# Altium footprint library SG_PCB_Fomin.PcbLib: 74 footprints (part 3 of 5)
Each footprint in its own frame and in the unit in brackets; x right, y up, seen from the top. Pads: shape width x height; smd on the part's side, far side on the other; paste and mask are expansions set on the pad; w line width, h text height; cw(c..) or ccw(c..) is an arc to the next point about the centre after c.
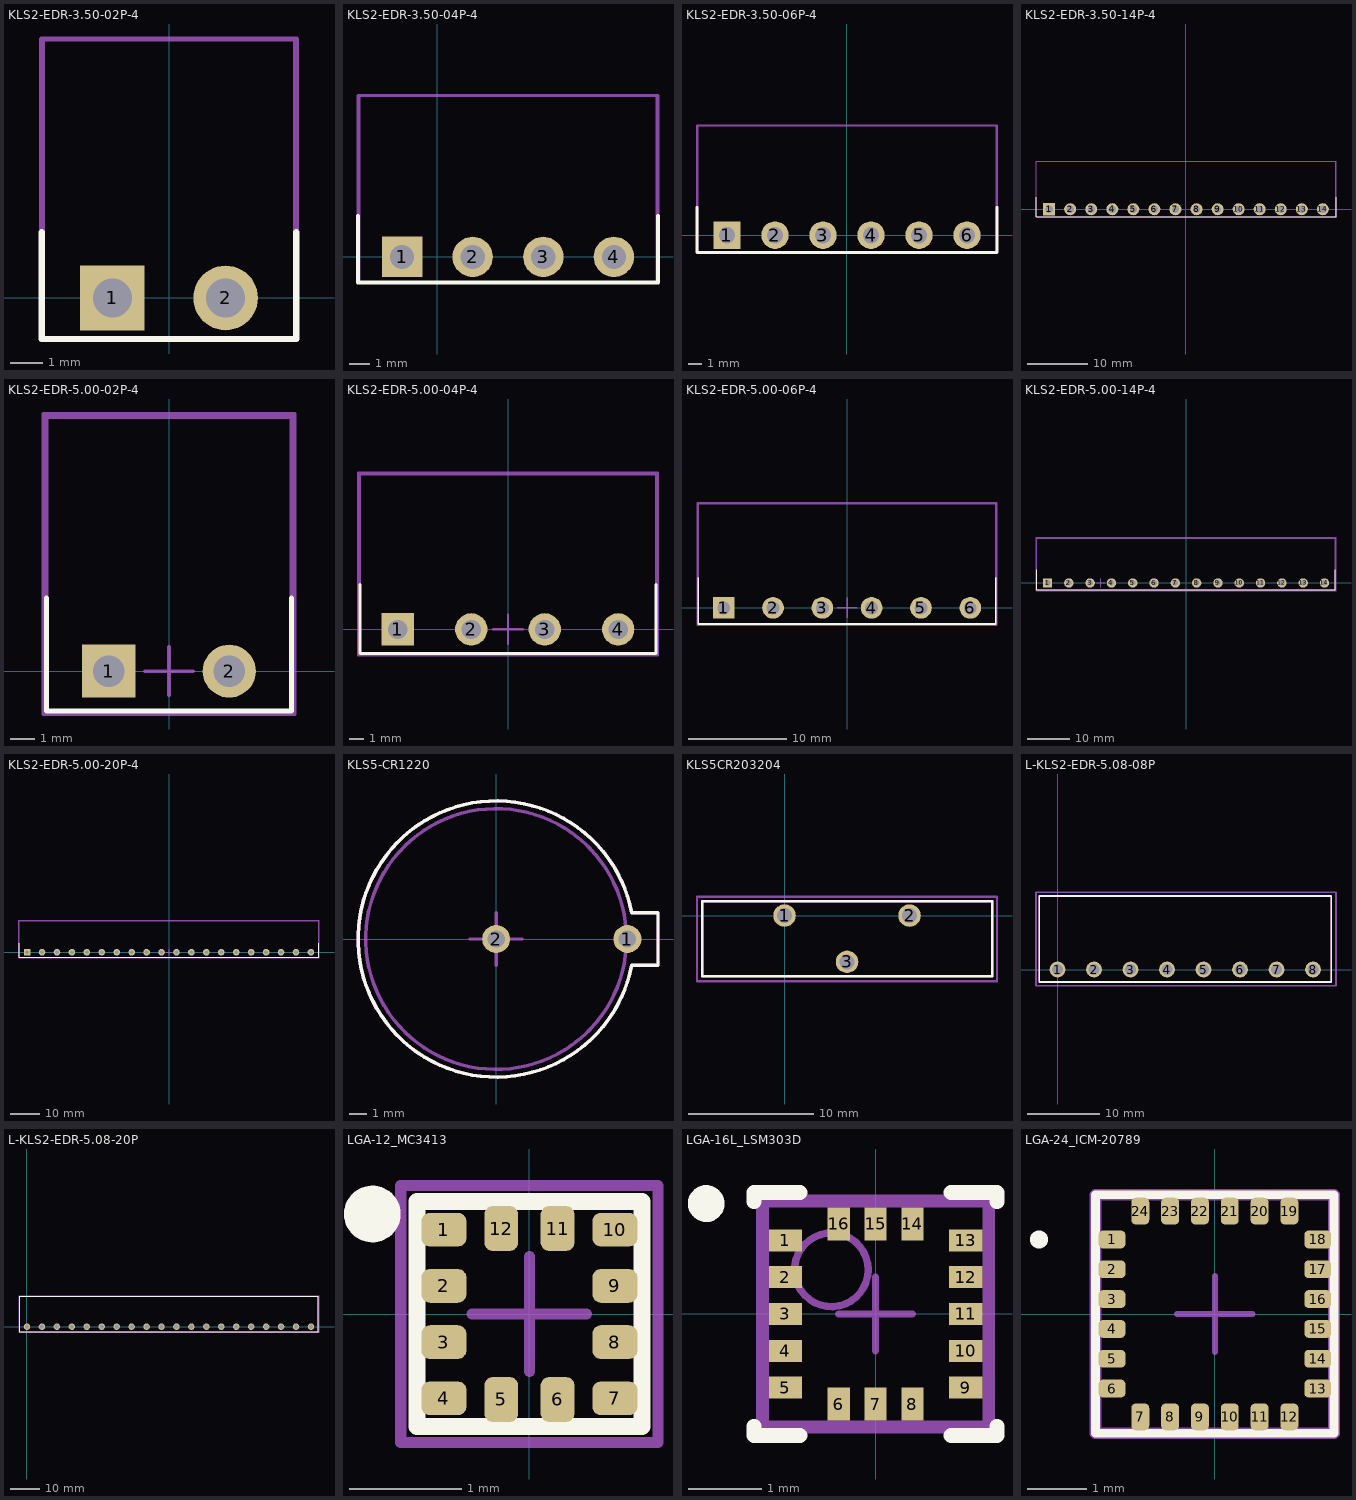
[diagram p2: the footprints below, top view; thin cyan lines are the x and y axes]

## KLS2-EDR-3.50-02P-4 [mm]
pads (2):
  rect 2x2 hole 1.2: 1(-1.75,0)
  round 2 hole 1.2: 2(1.75,0)
Top Overlay:
  lines w0.2: -3.937,2.032 -3.937,-1.27 3.937,-1.27 3.937,2.032
Top Assembly:
  lines w0.15: -3.937,-1.27 -3.937,8.001 3.937,8.001 3.937,-1.27 -3.937,-1.27
Top Courtyard:
  lines w0.15: -3.9,-1.27 3.9,-1.27 3.9,8 -3.9,8 -3.9,-1.27
3D body "User Library-15EDGRC-3_5-2.step": height 7.2, standoff -3.4, extent -3.9,-1.2 3.9,8

## KLS2-EDR-3.50-04P-4 [mm]
pads (4):
  rect 2x2 hole 1.2: 1(-1.75,0)
  round 2 hole 1.2: 2(1.75,0) 3(5.25,0) 4(8.75,0)
Top Overlay:
  lines w0.2: -3.937,2.032 -3.937,-1.27 3.937,-1.27 ; 3.063,-1.27 10.937,-1.27 10.937,2.032
Top Assembly:
  lines w0.15: 3.063,-1.27 10.937,-1.27 10.937,8.001 3.063,8.001 ; 3.937,-1.27 -3.937,-1.27 -3.937,8.001 3.937,8.001
Top Courtyard:
  lines w0.15: 3.1,-1.27 10.9,-1.27 10.9,8 3.1,8 ; 3.9,-1.27 -3.9,-1.27 -3.9,8 3.9,8
3D body "User Library-15EDGRC-3_5-04P.step": height 7.2, standoff -3.4, extent -3.9,-1.175 10.9,8.025

## KLS2-EDR-3.50-06P-4 [mm]
pads (6):
  rect 2x2 hole 1.2: 1(-8.75,0)
  round 2 hole 1.2: 2(-5.25,0) 3(-1.75,0) 4(1.75,0) 5(5.25,0) 6(8.75,0)
Top Overlay:
  lines w0.2: -10.937,2.032 -10.937,-1.27 -3.063,-1.27 ; -3.937,-1.27 3.937,-1.27 ; 3.063,-1.27 10.937,-1.27 10.937,2.032
Top Assembly:
  lines w0.15: -3.937,-1.27 3.937,-1.27 ; -3.937,8.001 3.937,8.001 ; -3.063,-1.27 -10.937,-1.27 -10.937,8.001 -3.063,8.001 ; 3.063,-1.27 10.937,-1.27 10.937,8.001 3.063,8.001
Top Courtyard:
  lines w0.15: -3.9,-1.27 3.9,-1.27 ; -3.9,8 3.9,8 ; -3.1,-1.27 -10.9,-1.27 -10.9,8 -3.1,8 ; 3.1,-1.27 10.9,-1.27 10.9,8 3.1,8
3D body "User Library-15EDGRC-3_5-2.step": height 7.2, standoff -3.4, extent 3.1,-1.2 10.9,8
3D body "User Library-15EDGRC-3_5-2.step": height 7.2, standoff -3.4, extent -3.9,-1.2 3.9,8
3D body "User Library-15EDGRC-3_5-2.step": height 7.2, standoff -3.4, extent -10.9,-1.2 -3.1,8

## KLS2-EDR-3.50-14P-4 [mm]
pads (14):
  rect 2x2 hole 1.2: 1(-22.75,0)
  round 2 hole 1.2: 2(-19.25,0) 3(-15.75,0) 4(-12.25,0) 5(-8.75,0) 6(-5.25,0) 7(-1.75,0) 8(1.75,0) 9(5.25,0) 10(8.75,0) 11(12.25,0) 12(15.75,0) 13(19.25,0) 14(22.75,0)
Top Overlay:
  lines w0.2: -24.937,2.032 -24.937,-1.27 -17.063,-1.27 ; -17.937,-1.27 -10.063,-1.27 ; -10.937,-1.27 -3.063,-1.27 ; -3.937,-1.27 3.937,-1.27 ; 3.063,-1.27 10.937,-1.27 ; 10.063,-1.27 17.937,-1.27 ; 17.063,-1.27 24.937,-1.27 24.937,2.032
Top Assembly:
  lines w0.15: -17.937,-1.27 -10.063,-1.27 ; -17.937,8.001 -10.063,8.001 ; -17.063,-1.27 -24.937,-1.27 -24.937,8.001 -17.063,8.001 ; -10.937,-1.27 -3.063,-1.27 ; -10.937,8.001 -3.063,8.001 ; -3.937,-1.27 3.937,-1.27 ; -3.937,8.001 3.937,8.001 ; 3.063,-1.27 10.937,-1.27 ; 3.063,8.001 10.937,8.001 ; 10.063,-1.27 17.937,-1.27 ; 10.063,8.001 17.937,8.001 ; 17.063,-1.27 24.937,-1.27 24.937,8.001 17.063,8.001
Top Courtyard:
  lines w0.15: -17.9,-1.27 -10.1,-1.27 ; -17.9,8 -10.1,8 ; -17.1,-1.27 -24.9,-1.27 -24.9,8 -17.1,8 ; -10.9,-1.27 -3.1,-1.27 ; -10.9,8 -3.1,8 ; -3.9,-1.27 3.9,-1.27 ; -3.9,8 3.9,8 ; 3.1,-1.27 10.9,-1.27 ; 3.1,8 10.9,8 ; 10.1,-1.27 17.9,-1.27 ; 10.1,8 17.9,8 ; 17.1,-1.27 24.9,-1.27 24.9,8 17.1,8
3D body "User Library-15EDGRC-3_5-2.step": height 7.2, standoff -3.4, extent 17.1,-1.2 24.9,8
3D body "User Library-15EDGRC-3_5-2.step": height 7.2, standoff -3.4, extent 10.1,-1.2 17.9,8
3D body "User Library-15EDGRC-3_5-2.step": height 7.2, standoff -3.4, extent 3.1,-1.2 10.9,8
3D body "User Library-15EDGRC-3_5-2.step": height 7.2, standoff -3.4, extent -3.9,-1.2 3.9,8
3D body "User Library-15EDGRC-3_5-2.step": height 7.2, standoff -3.4, extent -10.9,-1.2 -3.1,8
3D body "User Library-15EDGRC-3_5-2.step": height 7.2, standoff -3.4, extent -17.9,-1.2 -10.1,8
3D body "User Library-15EDGRC-3_5-2.step": height 7.2, standoff -3.4, extent -24.9,-1.2 -17.1,8

## KLS2-EDR-5.00-02P-4 [mm]
pads (2):
  rect 2.2x2.2 hole 1.3: 1(-2.5,0)
  round 2.2 hole 1.3: 2(2.5,0)
Top Overlay:
  lines w0.2: -5.08,3.048 -5.08,-1.651 5.08,-1.651 5.08,3.048
Top Assembly:
  lines w0.15: -5.08,-1.651 5.08,-1.651 5.08,10.541 -5.08,10.541 -5.08,-1.651
Top Courtyard:
  lines w0.15: -1,0 1,0 ; 0,-1 0,1 ; -5.207,-1.778 5.207,-1.778 5.207,10.668 -5.207,10.668 -5.207,-1.778
Top Designator:
  text ".Designator" at -6.858,3.81 h1.52
3D body "KLS2-EDR-5.00-2P.STEP": height 8.2, standoff -4, extent -5.04,-1.6 5.04,10.5

## KLS2-EDR-5.00-04P-4 [mm]
pads (4):
  rect 2.2x2.2 hole 1.3: 1(-7.5,0)
  round 2.2 hole 1.3: 2(-2.5,0) 3(2.5,0) 4(7.5,0)
Top Overlay:
  lines w0.2: -10.08,3.048 -10.08,-1.651 0.08,-1.651 ; -0.08,-1.651 10.08,-1.651 10.08,3.048
Top Assembly:
  lines w0.15: -0.08,-1.651 10.08,-1.651 10.08,10.541 -0.08,10.541 ; 0.08,-1.651 -10.08,-1.651 -10.08,10.541 0.08,10.541
Top Courtyard:
  lines w0.15: -1,0 1,0 ; -0.207,-1.778 10.207,-1.778 10.207,10.668 -0.207,10.668 ; 0,-1 0,1 ; 0.207,-1.778 -10.207,-1.778 -10.207,10.668 0.207,10.668
Top Designator:
  text ".Designator" at -6.837,4.24 h1.52
3D body "KLS2-EDR-5.00-2P.STEP": height 8.2, standoff -4, extent -10.04,-1.6 0.04,10.5
3D body "KLS2-EDR-5.00-2P.STEP": height 8.2, standoff -4, extent -0.04,-1.6 10.04,10.5

## KLS2-EDR-5.00-06P-4 [mm]
pads (6):
  rect 2.2x2.2 hole 1.3: 1(-12.5,0)
  round 2.2 hole 1.3: 2(-7.5,0) 3(-2.5,0) 4(2.5,0) 5(7.5,0) 6(12.5,0)
Top Overlay:
  lines w0.2: -15.08,3.048 -15.08,-1.651 -4.92,-1.651 4.92,-1.651 15.08,-1.651 15.08,3.048
Top Assembly:
  lines w0.15: -5.08,-1.651 5.08,-1.651 ; -5.08,10.541 5.08,10.541 ; -4.92,-1.651 -15.08,-1.651 -15.08,10.541 -4.92,10.541 ; 4.92,-1.651 15.08,-1.651 15.08,10.541 4.92,10.541
Top Courtyard:
  lines w0.15: -5.207,-1.778 5.207,-1.778 ; -5.207,10.668 5.207,10.668 ; -4.793,-1.778 -15.207,-1.778 -15.207,10.668 -4.793,10.668 ; -1,0 1,0 ; 0,-1 0,1 ; 4.793,-1.778 15.207,-1.778 15.207,10.668 4.793,10.668
Top Designator:
  text ".Designator" at -7.246,3.262 h1.52
3D body "KLS2-EDR-5.00-2P.STEP": height 8.2, standoff -4, extent 4.96,-1.6 15.04,10.5
3D body "KLS2-EDR-5.00-2P.STEP": height 8.2, standoff -4, extent -5.04,-1.6 5.04,10.5
3D body "KLS2-EDR-5.00-2P.STEP": height 8.2, standoff -4, extent -15.04,-1.6 -4.96,10.5

## KLS2-EDR-5.00-14P-4 [mm]
pads (14):
  rect 2.2x2.2 hole 1.3: 1(-32.5,0)
  round 2.2 hole 1.3: 2(-27.5,0) 3(-22.5,0) 4(-17.5,0) 5(-12.5,0) 6(-7.5,0) 7(-2.5,0) 8(2.5,0) 9(7.5,0) 10(12.5,0) 11(17.5,0) 12(22.5,0) 13(27.5,0) 14(32.5,0)
Top Overlay:
  lines w0.2: -35.08,3.048 -35.08,-1.651 -24.92,-1.651 -15.08,-1.651 -4.92,-1.651 ; -5.08,-1.651 5.08,-1.651 14.92,-1.651 25.08,-1.651 ; 24.92,-1.651 35.08,-1.651 35.08,3.048
Top Assembly:
  lines w0.15: -25.08,-1.651 -14.92,-1.651 ; -25.08,10.541 -14.92,10.541 ; -24.92,-1.651 -35.08,-1.651 -35.08,10.541 -24.92,10.541 ; -15.08,-1.651 -4.92,-1.651 ; -15.08,10.541 -4.92,10.541 ; -5.08,-1.651 5.08,-1.651 ; -5.08,10.541 5.08,10.541 ; 4.92,-1.651 15.08,-1.651 ; 4.92,10.541 15.08,10.541 ; 14.92,-1.651 25.08,-1.651 ; 14.92,10.541 25.08,10.541 ; 24.92,-1.651 35.08,-1.651 35.08,10.541 24.92,10.541
Top Courtyard:
  lines w0.15: -25.207,-1.778 -14.793,-1.778 ; -25.207,10.668 -14.793,10.668 ; -24.793,-1.778 -35.207,-1.778 -35.207,10.668 -24.793,10.668 ; -21,0 -19,0 ; -20,-1 -20,1 ; -15.207,-1.778 -4.793,-1.778 ; -15.207,10.668 -4.793,10.668 ; -5.207,-1.778 5.207,-1.778 ; -5.207,10.668 5.207,10.668 ; 4.793,-1.778 15.207,-1.778 ; 4.793,10.668 15.207,10.668 ; 14.793,-1.778 25.207,-1.778 ; 14.793,10.668 25.207,10.668 ; 24.793,-1.778 35.207,-1.778 35.207,10.668 24.793,10.668
Top Designator:
  text ".Designator" at -6.624,3.281 h1.52
3D body "KLS2-EDR-5.00-2P.STEP": height 8.2, standoff -4, extent 24.96,-1.6 35.04,10.5
3D body "KLS2-EDR-5.00-2P.STEP": height 8.2, standoff -4, extent -5.04,-1.6 5.04,10.5
3D body "KLS2-EDR-5.00-2P.STEP": height 8.2, standoff -4, extent 4.96,-1.6 15.04,10.5
3D body "KLS2-EDR-5.00-2P.STEP": height 8.2, standoff -4, extent 14.96,-1.6 25.04,10.5
3D body "KLS2-EDR-5.00-2P.STEP": height 8.2, standoff -4, extent -35.04,-1.6 -24.96,10.5
3D body "KLS2-EDR-5.00-2P.STEP": height 8.2, standoff -4, extent -25.04,-1.6 -14.96,10.5
3D body "KLS2-EDR-5.00-2P.STEP": height 8.2, standoff -4, extent -15.04,-1.6 -4.96,10.5

## KLS2-EDR-5.00-20P-4 [mm]
pads (20):
  rect 2.2x2.2 hole 1.3: 1(-47.5,0)
  round 2.2 hole 1.3: 2(-42.5,0) 3(-37.5,0) 4(-32.5,0) 5(-27.5,0) 6(-22.5,0) 7(-17.5,0) 8(-12.5,0) 9(-7.5,0) 10(-2.5,0) 11(2.5,0) 12(7.5,0) 13(12.5,0) 14(17.5,0) 15(22.5,0) 16(27.5,0) 17(32.5,0) 18(37.5,0) 19(42.5,0) 20(47.5,0)
Top Overlay:
  lines w0.2: -50.08,3.048 -50.08,-1.651 -39.92,-1.651 -30.08,-1.651 -19.92,-1.651 -10.08,-1.651 0.08,-1.651 9.92,-1.651 20.08,-1.651 29.92,-1.651 40.08,-1.651 ; 39.92,-1.651 50.08,-1.651 50.08,3.048
Top Assembly:
  lines w0.15: -40.08,-1.651 -29.92,-1.651 ; -40.08,10.541 -29.92,10.541 ; -39.92,-1.651 -50.08,-1.651 -50.08,10.541 -39.92,10.541 ; -30.08,-1.651 -19.92,-1.651 ; -30.08,10.541 -19.92,10.541 ; -20.08,-1.651 -9.92,-1.651 ; -20.08,10.541 -9.92,10.541 ; -10.08,-1.651 0.08,-1.651 ; -10.08,10.541 0.08,10.541 ; -0.08,-1.651 10.08,-1.651 ; -0.08,10.541 10.08,10.541 ; 9.92,-1.651 20.08,-1.651 ; 9.92,10.541 20.08,10.541 ; 19.92,-1.651 30.08,-1.651 ; 19.92,10.541 30.08,10.541 ; 29.92,-1.651 40.08,-1.651 ; 29.92,10.541 40.08,10.541 ; 39.92,-1.651 50.08,-1.651 50.08,10.541 39.92,10.541
Top Courtyard:
  lines w0.15: -40.207,-1.778 -29.793,-1.778 ; -40.207,10.668 -29.793,10.668 ; -39.793,-1.778 -50.207,-1.778 -50.207,10.668 -39.793,10.668 ; -30.207,-1.778 -19.793,-1.778 ; -30.207,10.668 -19.793,10.668 ; -20.207,-1.778 -9.793,-1.778 ; -20.207,10.668 -9.793,10.668 ; -10.207,-1.778 0.207,-1.778 ; -10.207,10.668 0.207,10.668 ; -1,0 1,0 ; -0.207,-1.778 10.207,-1.778 ; -0.207,10.668 10.207,10.668 ; 0,-1 0,1 ; 9.793,-1.778 20.207,-1.778 ; 9.793,10.668 20.207,10.668 ; 19.793,-1.778 30.207,-1.778 ; 19.793,10.668 30.207,10.668 ; 29.793,-1.778 40.207,-1.778 ; 29.793,10.668 40.207,10.668 ; 39.793,-1.778 50.207,-1.778 50.207,10.668 39.793,10.668
Top Designator:
  text ".Designator" at -7.246,3.262 h1.52
3D body "KLS2-EDR-5.00-2P.STEP": height 8.2, standoff -4, extent -50.04,-1.6 -39.96,10.5
3D body "KLS2-EDR-5.00-2P.STEP": height 8.2, standoff -4, extent -40.04,-1.6 -29.96,10.5
3D body "KLS2-EDR-5.00-2P.STEP": height 8.2, standoff -4, extent -30.04,-1.6 -19.96,10.5
3D body "KLS2-EDR-5.00-2P.STEP": height 8.2, standoff -4, extent -20.04,-1.6 -9.96,10.5
3D body "KLS2-EDR-5.00-2P.STEP": height 8.2, standoff -4, extent -10.04,-1.6 0.04,10.5
3D body "KLS2-EDR-5.00-2P.STEP": height 8.2, standoff -4, extent -0.04,-1.6 10.04,10.5
3D body "KLS2-EDR-5.00-2P.STEP": height 8.2, standoff -4, extent 9.96,-1.6 20.04,10.5
3D body "KLS2-EDR-5.00-2P.STEP": height 8.2, standoff -4, extent 19.96,-1.6 30.04,10.5
3D body "KLS2-EDR-5.00-2P.STEP": height 8.2, standoff -4, extent 29.96,-1.6 40.04,10.5
3D body "KLS2-EDR-5.00-2P.STEP": height 8.2, standoff -4, extent 39.96,-1.6 50.04,10.5

## KLS5-CR1220 [mm] "Battery slot 1220"
pads (2):
  round 1.6 hole 1: 1(7.5,0) 2(0,0)
Top Overlay:
  lines w0.2: 7.75,-1.5 cw(c0,0) 7.75,1.5 9.25,1.5 9.25,-1.5 7.75,-1.5
Top Assembly:
  circle w0.2: c0,0 r7.45
Top Courtyard:
  lines w0.2: -1.5,0 1.5,0 ; 0,-1.5 0,1.5 ; 7.75,-1.5 cw(c0,0) 7.75,1.5 9.25,1.5 9.25,-1.5 7.75,-1.5

## KLS5CR203204 [mm]
pads (3):
  round 1.8 hole 1.2: 1(0,0) 2(10,0) 3(5,-3.7)
Top Overlay:
  lines w0.2: -6.6,-4.85 16.6,-4.85 16.6,1.15 -6.6,1.15 -6.6,-4.85
Top Assembly:
  lines w0.2: -6.6,-4.85 16.6,-4.85 16.6,1.15 -6.6,1.15 -6.6,-4.85
Top Courtyard:
  lines w0.2: -7,-5.25 17,-5.25 17,-3.5 17,1.5 14.5,1.5 -7,1.5 -7,-5.25
3D body "LOTES_AAA-BAT-043-K01_PINS with battery.STEP": height 22.67, standoff -3.05, extent -6.65,-4.8 16.67,1

## L-KLS2-EDR-5.08-08P [mm]
pads (8):
  round 2.2 hole 1.5 unplated: 1(0,0) 2(5.08,0) 3(10.16,0) 4(15.24,0) 5(20.32,0) 6(25.4,0) 7(30.48,0) 8(35.56,0)
Top Overlay:
  lines w0.25: -2.54,-1.75 -2.54,10.25 38.1,10.25 38.1,-1.75 -2.54,-1.75
Top Assembly:
  lines w0.15: -2.54,-1.75 38.1,-1.75 38.1,10.25 -2.54,10.25 -2.54,-1.75
Top Courtyard:
  lines w0.25: -3,-2.25 -3,10.75 38.75,10.75 38.75,-2.25 -3,-2.25
Top Designator:
  text ".Designator" at 14.2,4.467 h0.8

## L-KLS2-EDR-5.08-20P [mm]
pads (20):
  round 2.2 hole 1.5 unplated: 1(0,0) 2(5.08,0) 3(10.16,0) 4(15.24,0) 5(20.32,0) 6(25.4,0) 7(30.48,0) 8(35.56,0) 9(40.64,0) 10(45.72,0) 11(50.8,0) 12(55.88,0) 13(60.96,0) 14(66.04,0) 15(71.12,0) 16(76.2,0) 17(81.28,0) 18(86.36,0) 19(91.44,0) 20(96.52,0)
Top Overlay:
  lines w0.25: -2.54,-1.75 99.06,-1.75 99.06,10.25 -2.54,10.25 -2.54,-1.75
Top Assembly:
  lines w0.15: -2.54,-1.75 99.06,-1.75 99.06,10.25 -2.54,10.25 -2.54,-1.75
Top Courtyard:
  lines w0.25: -2.714,-1.916 99.251,-1.916 99.251,10.513 -2.714,10.513 -2.714,-1.916
Top Designator:
  text ".Designator" at 44.2,4.467 h0.8

## LGA-12_MC3413 [mm]
pads (12):
  rrect50% 0.4x0.3 smd mask+0: 1(-0.76,0.75) 2(-0.76,0.25) 3(-0.76,-0.25) 4(-0.76,-0.75) 7(0.76,-0.75) 8(0.76,-0.25) 9(0.76,0.25) 10(0.76,0.75)
  rrect50% 0.3x0.4 smd mask+0: 5(-0.25,-0.76) 6(0.25,-0.76) 11(0.25,0.76) 12(-0.25,0.76)
Top Overlay:
  circle w0.25: c-1.397,0.889 r0.127
  lines w0.15: -1,-1 -1,1 1,1 1,-1 -1,-1
Top Solder:
  region: -0.5,0.54 -1.02,0.54 -1.02,0.96 -0.5,0.96
  region: -0.5,0.04 -1.021,0.04 -1.021,0.46 -0.5,0.46
  region: -0.5,-0.46 -1.02,-0.46 -1.02,-0.04 -0.5,-0.04
  region: -0.5,-0.961 -1.021,-0.961 -1.021,-0.54 -0.5,-0.54
  region: 1.025,0.54 0.505,0.54 0.505,0.96 1.025,0.96
  region: 1.025,0.04 0.505,0.04 0.505,0.46 1.025,0.46
  region: 1.025,-0.461 0.506,-0.461 0.506,-0.04 1.025,-0.04
  region: 1.025,-0.96 0.505,-0.96 0.505,-0.54 1.025,-0.54
  region: -0.04,0.5 -0.46,0.5 -0.46,1.02 -0.04,1.02
  region: 0.46,0.501 0.04,0.501 0.04,1.02 0.46,1.02
  region: -0.04,-1.02 -0.46,-1.02 -0.46,-0.5 -0.04,-0.5
  region: 0.46,-1.02 0.04,-1.02 0.04,-0.5 0.46,-0.5
Top Assembly:
  lines w0.1: -1.016,-1.016 1.016,-1.016 1.016,1.016 -1.016,1.016 -1.016,-1.016
Top Courtyard:
  lines w0.1: -0.508,0 0.508,0 ; 0,-0.508 0,0.508 ; -1.143,-1.143 1.143,-1.143 1.143,1.143 -1.143,1.143 -1.143,-1.143
Top Designator:
  text ".Designator" at -0.799,-0.267 h0.5
3D body "LSM303CTR-LGA12.STEP": height 1, standoff 0, extent -1,-1 1,1

## LGA-16L_LSM303D [mm] "QFN, 16-Leads, Body 3,00x3,00mm, Pitch 0,50mm, Thermal Pad 1,25x2,25mm, IPC Medium Density"
height 1
pads (16):
  rect 0.45x0.3 smd: 1(-1.225,1) 2(-1.225,0.5) 3(-1.225,0) 4(-1.225,-0.5) 5(-1.225,-1) 9(1.225,-1) 10(1.225,-0.5) 11(1.225,0) 12(1.225,0.5) 13(1.225,1)
  rect 0.3x0.45 smd: 6(-0.5,-1.225) 7(0,-1.225) 8(0.5,-1.225) 14(0.5,1.225) 15(0,1.225) 16(-0.5,1.225)
Top Overlay:
  circle w0.25: c-2.3,1.5 r0.125
  lines w0.2: -1.65,-1.525 -1.65,-1.65 -1.025,-1.65 ; -1.65,1.525 -1.65,1.65 -1.025,1.65 ; 1.025,-1.65 1.65,-1.65 1.65,-1.525 ; 1.025,1.65 1.65,1.65 1.65,1.525
Top Assembly:
  circle w0.1: c-0.6,0.6 r0.5
  lines w0.1: -1.5,-1.5 -1.5,1.5 1.5,1.5 1.5,-1.5 -1.5,-1.5
Top Courtyard:
  lines w0.1: -0.5,0 0.5,0 ; 0,-0.5 0,0.5 ; -1.574,-1.574 1.574,-1.574 1.574,1.574 -1.574,1.574 -1.574,-1.574
Top Designator:
  text ".Designator" at -7.843,-0.508 h1.52
3D body "User Library-LIS331AL.step": height 1.01, standoff -0.01, extent -1.5,-1.5 1.5,1.5

## LGA-24_ICM-20789 [mm]
pads (24):
  rrect50% 0.45x0.3 smd: 1(-1.725,1.25) 2(-1.725,0.75) 3(-1.725,0.25) 4(-1.725,-0.25) 5(-1.725,-0.75) 6(-1.725,-1.25) 13(1.725,-1.25) 14(1.725,-0.75) 15(1.725,-0.25) 16(1.725,0.25) 17(1.725,0.75) 18(1.725,1.25)
  rrect50% 0.3x0.45 smd: 7(-1.25,-1.725) 8(-0.75,-1.725) 9(-0.25,-1.725) 10(0.25,-1.725) 11(0.75,-1.725) 12(1.25,-1.725) 19(1.25,1.725) 20(0.75,1.725) 21(0.25,1.725) 22(-0.25,1.725) 23(-0.75,1.725) 24(-1.25,1.725)
Top Overlay:
  lines w0.15: -2,-2 2,-2 2,2 -2,2 -2,-2
  lines w0.2: -3,1.25 ccw(c-2.95,1.25) -2.9,1.25 ; -3,1.25 cw(c-2.95,1.25) -2.9,1.25 ; -3,1.25 ccw(c-2.95,1.25) -2.9,1.25
Top Assembly:
  lines w0.2: -2,-2 2,-2 2,2 -2,2 -2,-2
Top Courtyard:
  lines w0.1: -0.635,0 0.635,0 ; 0,-0.635 0,0.635 ; -2.032,-2.032 2.032,-2.032 2.032,2.032 -2.032,2.032 -2.032,-2.032
Top Designator:
  text ".Designator" at -4.998,-0.317 h1
3D body "ICM-20789.stp": height 1.57, standoff 0, extent -2,-2 2,2